# Altium footprint library PcbLib_ICs.PcbLib: 317 footprints (part 19 of 24) (continued)
## TO-220-2 [mm] (continued)
  text ".Designator" at 0.7,-5.162 h3
3D body "TO220-2.STEP": height 20.05, standoff -3.5, extent -1.55,-4.95 2.907,4.95

## TO-220-3 [mm]
height 4.57
pads (4):
  rect 3.2x2 hole 1.2: 1(3.3,2.5)
  oval 3.2x2 hole 1.2: 2(0,0) 3(3.3,-2.5)
  rect 16x12 smd paste-10: 2(15.444,0)
Top Overlay:
  circle w0.25: c0.75,2.5 r0.125
  lines w0.2: 6.2,-5.5 6.2,5.5
Top Paste:
  rectangle: 9.444,-5.1 10.444,-4.1
  rectangle: 10.678,-5.1 11.678,-4.1
  rectangle: 11.911,-5.1 12.911,-4.1
  rectangle: 13.144,-5.1 14.144,-4.1
  rectangle: 14.378,-5.1 15.378,-4.1
  rectangle: 15.611,-5.1 16.611,-4.1
  rectangle: 16.844,-5.1 17.844,-4.1
  rectangle: 9.444,-3.95 10.444,-2.95
  rectangle: 9.444,-2.8 10.444,-1.8
  rectangle: 9.444,-1.65 10.444,-0.65
  rectangle: 9.444,-0.5 10.444,0.5
  rectangle: 9.444,0.65 10.444,1.65
  rectangle: 9.444,1.8 10.444,2.8
  rectangle: 9.444,2.95 10.444,3.95
  rectangle: 9.444,4.1 10.444,5.1
  rectangle: 10.678,4.1 11.678,5.1
  rectangle: 10.678,2.95 11.678,3.95
  rectangle: 10.678,1.8 11.678,2.8
  rectangle: 10.678,0.65 11.678,1.65
  rectangle: 10.678,-0.5 11.678,0.5
  rectangle: 10.678,-1.65 11.678,-0.65
  rectangle: 10.678,-2.8 11.678,-1.8
  rectangle: 10.678,-3.95 11.678,-2.95
  rectangle: 11.911,4.1 12.911,5.1
  rectangle: 11.911,2.95 12.911,3.95
  rectangle: 11.911,1.8 12.911,2.8
  rectangle: 11.911,0.65 12.911,1.65
  rectangle: 11.911,-0.5 12.911,0.5
  rectangle: 11.911,-1.65 12.911,-0.65
  rectangle: 11.911,-2.8 12.911,-1.8
  rectangle: 11.911,-3.95 12.911,-2.95
  rectangle: 13.144,4.1 14.144,5.1
  rectangle: 13.144,2.95 14.144,3.95
  rectangle: 13.144,1.8 14.144,2.8
  rectangle: 13.144,0.65 14.144,1.65
  rectangle: 13.144,-0.5 14.144,0.5
  rectangle: 13.144,-1.65 14.144,-0.65
  rectangle: 13.144,-2.8 14.144,-1.8
  rectangle: 13.144,-3.95 14.144,-2.95
  rectangle: 14.378,4.1 15.378,5.1
  rectangle: 14.378,2.95 15.378,3.95
  rectangle: 14.378,1.8 15.378,2.8
  rectangle: 14.378,0.65 15.378,1.65
  rectangle: 14.378,-0.5 15.378,0.5
  rectangle: 14.378,-1.65 15.378,-0.65
  rectangle: 14.378,-2.8 15.378,-1.8
  rectangle: 14.378,-3.95 15.378,-2.95
  rectangle: 15.611,4.1 16.611,5.1
  rectangle: 15.611,2.95 16.611,3.95
  rectangle: 15.611,1.8 16.611,2.8
  rectangle: 15.611,0.65 16.611,1.65
  rectangle: 15.611,-0.5 16.611,0.5
  rectangle: 15.611,-1.65 16.611,-0.65
  rectangle: 15.611,-2.8 16.611,-1.8
  rectangle: 15.611,-3.95 16.611,-2.95
  rectangle: 16.844,4.1 17.844,5.1
  rectangle: 16.844,2.95 17.844,3.95
  rectangle: 16.844,1.8 17.844,2.8
  rectangle: 16.844,0.65 17.844,1.65
  rectangle: 16.844,-0.5 17.844,0.5
  rectangle: 16.844,-1.65 17.844,-0.65
  rectangle: 16.844,-2.8 17.844,-1.8
  rectangle: 16.844,-3.95 17.844,-2.95
Top Assy:
  circle w0.05: c20.076,0 r1.75
  lines w0.05: 7.296,-3.2 7.296,-5.01 ; 7.296,-1.8 7.296,-0.7 ; 7.296,0.7 7.296,1.8 ; 7.296,3.2 7.296,5 ; -0.45,-0.45 -0.45,0.45 ; -0.45,-0.45 0.546,-0.45 ; -0.45,-0.45 -0.455,-0.45 -0.455,0.45 -0.45,0.45 ; -0.45,0.45 0.546,0.45 ; 0.546,-0.45 0.546,0.45 ; 0.546,-0.45 3.796,-0.45 4.296,-0.7 7.469,-0.7 7.469,0.7 4.296,0.7 3.796,0.45 0.546,0.45 ; 2.791,2.05 2.791,2.95 ; 2.791,2.05 3.786,2.05 ; 2.791,2.05 2.783,2.05 2.783,2.95 2.791,2.95 ; 2.791,2.95 3.786,2.95 ; 2.801,-2.95 2.801,-2.05 ; 2.801,-2.95 3.786,-2.95 ; 2.801,-2.95 2.793,-2.95 2.793,-2.05 2.801,-2.05 ; 2.801,-2.05 3.786,-2.05 ; 3.786,-2.95 3.796,-2.95 4.296,-3.2 7.469,-3.2 7.469,-1.8 4.296,-1.8 3.796,-2.05 3.786,-2.05 ; 3.786,-2.95 3.786,-2.05 ; 3.786,2.05 3.796,2.05 4.296,1.8 7.469,1.8 7.469,3.2 4.296,3.2 3.796,2.95 3.786,2.95 ; 3.786,2.05 3.786,2.95 ; 7.296,-5.01 7.611,-4.695 ; 7.296,-5.01 16.286,-5.01 ; 7.296,5 7.611,4.685 ; 7.296,5 16.286,5 15.971,4.685 ; 7.611,-4.695 15.971,-4.695 ; 7.611,-4.695 7.611,4.685 ; 7.611,4.685 15.971,4.685 ; 15.971,-4.695 15.971,4.685 ; 15.971,-4.695 16.286,-5.01 ; 16.286,-5.01 19.296,-5.01 19.296,-4.2 20.943,-4.2 20.943,-5.01 22.796,-5.01 22.796,5.01 20.896,5.01 20.896,4.3 19.296,4.3 19.296,5.01 16.286,5.01 16.286,4 ; 16.286,-5.01 16.286,-4 ; 16.285,-4 16.285,4 ; 16.285,-4 16.286,-4 ; 16.285,4 16.286,4
  text ".Designator" at 5.327,-0.7 h3
3D body "TO-220.STEP": height 4.5, standoff -3.15, extent -0.325,-5.02 22.925,5

## TO-220-3 (hole mounting) [mm]
height 4.57
pads (5):
  rect 3.2x2 hole 1.2: 1(3.3,2.5)
  oval 3.2x2 hole 1.2: 2(0,0) 3(3.3,-2.5)
  rect 16x12 smd paste-10: 2(15.444,0)
  round 0 hole 3.4 unplated: 6(20.076,0)
Top Overlay:
  circle w0.25: c0.75,2.5 r0.125
  lines w0.2: 6.2,-5.5 6.2,5.5
Top Paste:
  rectangle: 16.844,-3.95 17.844,-2.95
  rectangle: 16.844,-2.8 17.844,-1.8
  rectangle: 16.844,-1.65 17.844,-0.65
  rectangle: 16.844,-0.5 17.844,0.5
  rectangle: 16.844,0.65 17.844,1.65
  rectangle: 16.844,1.8 17.844,2.8
  rectangle: 16.844,2.95 17.844,3.95
  rectangle: 16.844,4.1 17.844,5.1
  rectangle: 15.611,-3.95 16.611,-2.95
  rectangle: 15.611,-2.8 16.611,-1.8
  rectangle: 15.611,-1.65 16.611,-0.65
  rectangle: 15.611,-0.5 16.611,0.5
  rectangle: 15.611,0.65 16.611,1.65
  rectangle: 15.611,1.8 16.611,2.8
  rectangle: 15.611,2.95 16.611,3.95
  rectangle: 15.611,4.1 16.611,5.1
  rectangle: 14.378,-3.95 15.378,-2.95
  rectangle: 14.378,-2.8 15.378,-1.8
  rectangle: 14.378,-1.65 15.378,-0.65
  rectangle: 14.378,-0.5 15.378,0.5
  rectangle: 14.378,0.65 15.378,1.65
  rectangle: 14.378,1.8 15.378,2.8
  rectangle: 14.378,2.95 15.378,3.95
  rectangle: 14.378,4.1 15.378,5.1
  rectangle: 13.144,-3.95 14.144,-2.95
  rectangle: 13.144,-2.8 14.144,-1.8
  rectangle: 13.144,-1.65 14.144,-0.65
  rectangle: 13.144,-0.5 14.144,0.5
  rectangle: 13.144,0.65 14.144,1.65
  rectangle: 13.144,1.8 14.144,2.8
  rectangle: 13.144,2.95 14.144,3.95
  rectangle: 13.144,4.1 14.144,5.1
  rectangle: 11.911,-3.95 12.911,-2.95
  rectangle: 11.911,-2.8 12.911,-1.8
  rectangle: 11.911,-1.65 12.911,-0.65
  rectangle: 11.911,-0.5 12.911,0.5
  rectangle: 11.911,0.65 12.911,1.65
  rectangle: 11.911,1.8 12.911,2.8
  rectangle: 11.911,2.95 12.911,3.95
  rectangle: 11.911,4.1 12.911,5.1
  rectangle: 10.678,-3.95 11.678,-2.95
  rectangle: 10.678,-2.8 11.678,-1.8
  rectangle: 10.678,-1.65 11.678,-0.65
  rectangle: 10.678,-0.5 11.678,0.5
  rectangle: 10.678,0.65 11.678,1.65
  rectangle: 10.678,1.8 11.678,2.8
  rectangle: 10.678,2.95 11.678,3.95
  rectangle: 10.678,4.1 11.678,5.1
  rectangle: 9.444,4.1 10.444,5.1
  rectangle: 9.444,2.95 10.444,3.95
  rectangle: 9.444,1.8 10.444,2.8
  rectangle: 9.444,0.65 10.444,1.65
  rectangle: 9.444,-0.5 10.444,0.5
  rectangle: 9.444,-1.65 10.444,-0.65
  rectangle: 9.444,-2.8 10.444,-1.8
  rectangle: 9.444,-3.95 10.444,-2.95
  rectangle: 16.844,-5.1 17.844,-4.1
  rectangle: 15.611,-5.1 16.611,-4.1
  rectangle: 14.378,-5.1 15.378,-4.1
  rectangle: 13.144,-5.1 14.144,-4.1
  rectangle: 11.911,-5.1 12.911,-4.1
  rectangle: 10.678,-5.1 11.678,-4.1
  rectangle: 9.444,-5.1 10.444,-4.1
Top Assy:
  circle w0.05: c20.076,0 r1.75
  lines w0.05: 7.296,-3.2 7.296,-5.01 ; 7.296,-1.8 7.296,-0.7 ; 7.296,0.7 7.296,1.8 ; 7.296,3.2 7.296,5 ; -0.45,-0.45 -0.455,-0.45 -0.455,0.45 -0.45,0.45 ; -0.45,-0.45 0.546,-0.45 ; -0.45,-0.45 -0.45,0.45 ; -0.45,0.45 0.546,0.45 ; 0.546,-0.45 3.796,-0.45 4.296,-0.7 7.469,-0.7 7.469,0.7 4.296,0.7 3.796,0.45 0.546,0.45 ; 0.546,-0.45 0.546,0.45 ; 2.791,2.05 2.783,2.05 2.783,2.95 2.791,2.95 ; 2.791,2.05 3.786,2.05 ; 2.791,2.05 2.791,2.95 ; 2.791,2.95 3.786,2.95 ; 2.801,-2.95 2.793,-2.95 2.793,-2.05 2.801,-2.05 ; 2.801,-2.95 3.786,-2.95 ; 2.801,-2.95 2.801,-2.05 ; 2.801,-2.05 3.786,-2.05 ; 3.786,-2.95 3.786,-2.05 ; 3.786,-2.95 3.796,-2.95 4.296,-3.2 7.469,-3.2 7.469,-1.8 4.296,-1.8 3.796,-2.05 3.786,-2.05 ; 3.786,2.05 3.786,2.95 ; 3.786,2.05 3.796,2.05 4.296,1.8 7.469,1.8 7.469,3.2 4.296,3.2 3.796,2.95 3.786,2.95 ; 7.296,-5.01 16.286,-5.01 ; 7.296,-5.01 7.611,-4.695 ; 7.296,5 16.286,5 15.971,4.685 ; 7.296,5 7.611,4.685 ; 7.611,-4.695 7.611,4.685 ; 7.611,-4.695 15.971,-4.695 ; 7.611,4.685 15.971,4.685 ; 15.971,-4.695 16.286,-5.01 ; 15.971,-4.695 15.971,4.685 ; 16.286,-5.01 16.286,-4 ; 16.286,-5.01 19.296,-5.01 19.296,-4.2 20.943,-4.2 20.943,-5.01 22.796,-5.01 22.796,5.01 20.896,5.01 20.896,4.3 19.296,4.3 19.296,5.01 16.286,5.01 16.286,4 ; 16.285,-4 16.286,-4 ; 16.285,-4 16.285,4 ; 16.285,4 16.286,4
  text ".Designator" at 5.327,-0.7 h3
3D body "TO-220.STEP": height 4.5, standoff -3.15, extent -0.325,-5.02 22.925,5

## TO-220-5 [mm]
height 4.57
pads (6):
  rect 3.2x2 hole 1.2: 1(0,3.4)
  oval 3.2x2 hole 1.2: 2(3.55,1.7) 3(0,0) 4(3.55,-1.7) 5(0,-3.4)
  rect 16x12 smd paste-10: 6(15.444,0)
Top Overlay:
  circle w0.25: c0,5.2 r0.125
  lines w0.2: 6.2,-5.5 6.2,5.5
Top Paste:
  rectangle: 9.444,-5.1 10.444,-4.1
  rectangle: 10.678,-5.1 11.678,-4.1
  rectangle: 11.911,-5.1 12.911,-4.1
  rectangle: 13.144,-5.1 14.144,-4.1
  rectangle: 14.378,-5.1 15.378,-4.1
  rectangle: 15.611,-5.1 16.611,-4.1
  rectangle: 16.844,-5.1 17.844,-4.1
  rectangle: 9.444,-3.95 10.444,-2.95
  rectangle: 9.444,-2.8 10.444,-1.8
  rectangle: 9.444,-1.65 10.444,-0.65
  rectangle: 9.444,-0.5 10.444,0.5
  rectangle: 9.444,0.65 10.444,1.65
  rectangle: 9.444,1.8 10.444,2.8
  rectangle: 9.444,2.95 10.444,3.95
  rectangle: 9.444,4.1 10.444,5.1
  rectangle: 10.678,4.1 11.678,5.1
  rectangle: 10.678,2.95 11.678,3.95
  rectangle: 10.678,1.8 11.678,2.8
  rectangle: 10.678,0.65 11.678,1.65
  rectangle: 10.678,-0.5 11.678,0.5
  rectangle: 10.678,-1.65 11.678,-0.65
  rectangle: 10.678,-2.8 11.678,-1.8
  rectangle: 10.678,-3.95 11.678,-2.95
  rectangle: 11.911,4.1 12.911,5.1
  rectangle: 11.911,2.95 12.911,3.95
  rectangle: 11.911,1.8 12.911,2.8
  rectangle: 11.911,0.65 12.911,1.65
  rectangle: 11.911,-0.5 12.911,0.5
  rectangle: 11.911,-1.65 12.911,-0.65
  rectangle: 11.911,-2.8 12.911,-1.8
  rectangle: 11.911,-3.95 12.911,-2.95
  rectangle: 13.144,4.1 14.144,5.1
  rectangle: 13.144,2.95 14.144,3.95
  rectangle: 13.144,1.8 14.144,2.8
  rectangle: 13.144,0.65 14.144,1.65
  rectangle: 13.144,-0.5 14.144,0.5
  rectangle: 13.144,-1.65 14.144,-0.65
  rectangle: 13.144,-2.8 14.144,-1.8
  rectangle: 13.144,-3.95 14.144,-2.95
  rectangle: 14.378,4.1 15.378,5.1
  rectangle: 14.378,2.95 15.378,3.95
  rectangle: 14.378,1.8 15.378,2.8
  rectangle: 14.378,0.65 15.378,1.65
  rectangle: 14.378,-0.5 15.378,0.5
  rectangle: 14.378,-1.65 15.378,-0.65
  rectangle: 14.378,-2.8 15.378,-1.8
  rectangle: 14.378,-3.95 15.378,-2.95
  rectangle: 15.611,4.1 16.611,5.1
  rectangle: 15.611,2.95 16.611,3.95
  rectangle: 15.611,1.8 16.611,2.8
  rectangle: 15.611,0.65 16.611,1.65
  rectangle: 15.611,-0.5 16.611,0.5
  rectangle: 15.611,-1.65 16.611,-0.65
  rectangle: 15.611,-2.8 16.611,-1.8
  rectangle: 15.611,-3.95 16.611,-2.95
  rectangle: 16.844,4.1 17.844,5.1
  rectangle: 16.844,2.95 17.844,3.95
  rectangle: 16.844,1.8 17.844,2.8
  rectangle: 16.844,0.65 17.844,1.65
  rectangle: 16.844,-0.5 17.844,0.5
  rectangle: 16.844,-1.65 17.844,-0.65
  rectangle: 16.844,-2.8 17.844,-1.8
  rectangle: 16.844,-3.95 17.844,-2.95
Top Assy:
  circle w0.05: c19.3,0 r1.925
  lines w0.05: 6.5,-4 4.85,-4 ; 6.5,-2.8 4.85,-2.8 ; 6.5,-2.3 4.95,-2.3 ; 6.5,-1.1 4.95,-1.1 ; 6.5,-0.62 4.85,-0.62 ; 6.5,0.62 4.85,0.62 ; 6.5,1.1 4.95,1.1 ; 6.5,2.3 4.95,2.3 ; 6.5,2.8 4.85,2.8 ; 6.5,4 4.85,4 ; 15.625,-5.125 22.225,-5.125 22.225,5.125 15.625,5.125 ; 0.583,-3.9 0.583,-2.9 ; 0.583,-3.9 0,-3.9 0,-2.9 0.583,-2.9 ; 0.583,-3.9 3.9,-3.9 3.9,-4 4.394,-4 ; 0.583,-2.9 3.9,-2.9 3.9,-2.8 4.394,-2.8 ; 0.583,-0.5 0.583,0.5 ; 0.583,-0.5 0,-0.5 0,0.5 0.583,0.5 ; 0.583,-0.5 3.9,-0.5 3.9,-0.62 4.394,-0.62 ; 0.583,0.5 3.9,0.5 3.9,0.62 4.394,0.62 ; 0.583,2.9 0.583,3.9 ; 0.583,2.9 0,2.9 0,3.9 0.583,3.9 ; 0.583,2.9 3.9,2.9 3.9,2.8 4.394,2.8 ; 0.583,3.9 3.9,3.9 3.9,4 4.394,4 ; 4.394,-4 4.394,-2.8 ; 4.394,-4 4.85,-4 ; 4.394,-2.8 4.85,-2.8 ; 4.394,-0.62 4.394,0.62 ; 4.394,-0.62 4.85,-0.62 ; 4.394,0.62 4.85,0.62 ; 4.394,2.8 4.394,4 ; 4.394,2.8 4.85,2.8 ; 4.394,4 4.85,4 ; 4.85,-4 4.85,-2.8 ; 4.85,-0.62 4.85,0.62 ; 4.85,2.8 4.85,4 ; 4.95,-2.3 4.95,-1.1 ; 4.95,-2.3 3.75,-2.3 3.75,-2.2 3.75,-1.2 3.75,-1.1 4.95,-1.1 ; 4.95,1.1 4.95,2.3 ; 4.95,1.1 3.75,1.1 3.75,1.2 3.75,2.2 3.75,2.3 4.95,2.3 ; 6.5,-4.948 6.5,-5.074 6.71,-5.2 15.625,-5.2 15.625,-5.019 ; 6.5,-4.948 6.5,4.948 ; 6.5,-4.948 8.858,-4.948 ; 6.5,4.948 6.5,5.074 6.71,5.2 15.625,5.2 15.625,5.019 ; 6.5,4.948 8.858,4.948 ; 8.858,-4.948 cw(c10,-5.2) 11.142,-4.948 ; 8.858,-4.948 8.956,-5.065 9.003,-5.118 ; 8.858,4.948 ccw(c10,5.2) 11.142,4.948 ; 8.858,4.948 8.916,5.018 9.003,5.118 ; 9.003,-5.118 cw(c10,-5.2) 10.997,-5.118 ; 9.003,-5.118 10.997,-5.118 ; 9.003,5.118 ccw(c10,5.2) 10.997,5.118 ; 9.003,5.118 10.997,5.118 ; 10.997,-5.118 11.084,-5.018 11.142,-4.948 ; 10.997,5.118 11.044,5.065 11.142,4.948 ; 11.142,-4.948 14.388,-4.948 ; 11.142,4.948 14.388,4.948 ; 14.388,-4.948 15.625,-5.019 ; 14.388,-4.948 14.388,4.948 ; 14.388,4.948 15.625,5.019 ; 15.625,-5.019 15.625,5.019
  text ".Designator" at 5.282,-0.7 h3
3D body "User Library-TO-220-5_bent_leads.step": height 4.85, standoff -6.05, extent -0.2,-5.2 22.025,5.2

## TO-220-5 (hole mounting) [mm]
height 4.57
pads (7):
  rect 3.2x2 hole 1.2: 1(0,3.4)
  oval 3.2x2 hole 1.2: 2(3.55,1.7) 3(0,0) 4(3.55,-1.7) 5(0,-3.4)
  rect 16x12 smd paste-10: 6(15.444,0)
  round 0 hole 3.4 unplated: 6(19.3,0)
Top Overlay:
  circle w0.25: c0,5.2 r0.125
  lines w0.2: 6.2,-5.5 6.2,5.5
Top Paste:
  rectangle: 16.844,-3.95 17.844,-2.95
  rectangle: 16.844,-2.8 17.844,-1.8
  rectangle: 16.844,-1.65 17.844,-0.65
  rectangle: 16.844,-0.5 17.844,0.5
  rectangle: 16.844,0.65 17.844,1.65
  rectangle: 16.844,1.8 17.844,2.8
  rectangle: 16.844,2.95 17.844,3.95
  rectangle: 16.844,4.1 17.844,5.1
  rectangle: 15.611,-3.95 16.611,-2.95
  rectangle: 15.611,-2.8 16.611,-1.8
  rectangle: 15.611,-1.65 16.611,-0.65
  rectangle: 15.611,-0.5 16.611,0.5
  rectangle: 15.611,0.65 16.611,1.65
  rectangle: 15.611,1.8 16.611,2.8
  rectangle: 15.611,2.95 16.611,3.95
  rectangle: 15.611,4.1 16.611,5.1
  rectangle: 14.378,-3.95 15.378,-2.95
  rectangle: 14.378,-2.8 15.378,-1.8
  rectangle: 14.378,-1.65 15.378,-0.65
  rectangle: 14.378,-0.5 15.378,0.5
  rectangle: 14.378,0.65 15.378,1.65
  rectangle: 14.378,1.8 15.378,2.8
  rectangle: 14.378,2.95 15.378,3.95
  rectangle: 14.378,4.1 15.378,5.1
  rectangle: 13.144,-3.95 14.144,-2.95
  rectangle: 13.144,-2.8 14.144,-1.8
  rectangle: 13.144,-1.65 14.144,-0.65
  rectangle: 13.144,-0.5 14.144,0.5
  rectangle: 13.144,0.65 14.144,1.65
  rectangle: 13.144,1.8 14.144,2.8
  rectangle: 13.144,2.95 14.144,3.95
  rectangle: 13.144,4.1 14.144,5.1
  rectangle: 11.911,-3.95 12.911,-2.95
  rectangle: 11.911,-2.8 12.911,-1.8
  rectangle: 11.911,-1.65 12.911,-0.65
  rectangle: 11.911,-0.5 12.911,0.5
  rectangle: 11.911,0.65 12.911,1.65
  rectangle: 11.911,1.8 12.911,2.8
  rectangle: 11.911,2.95 12.911,3.95
  rectangle: 11.911,4.1 12.911,5.1
  rectangle: 10.678,-3.95 11.678,-2.95
  rectangle: 10.678,-2.8 11.678,-1.8
  rectangle: 10.678,-1.65 11.678,-0.65
  rectangle: 10.678,-0.5 11.678,0.5
  rectangle: 10.678,0.65 11.678,1.65
  rectangle: 10.678,1.8 11.678,2.8
  rectangle: 10.678,2.95 11.678,3.95
  rectangle: 10.678,4.1 11.678,5.1
  rectangle: 9.444,4.1 10.444,5.1
  rectangle: 9.444,2.95 10.444,3.95
  rectangle: 9.444,1.8 10.444,2.8
  rectangle: 9.444,0.65 10.444,1.65
  rectangle: 9.444,-0.5 10.444,0.5
  rectangle: 9.444,-1.65 10.444,-0.65
  rectangle: 9.444,-2.8 10.444,-1.8
  rectangle: 9.444,-3.95 10.444,-2.95
  rectangle: 16.844,-5.1 17.844,-4.1
  rectangle: 15.611,-5.1 16.611,-4.1
  rectangle: 14.378,-5.1 15.378,-4.1
  rectangle: 13.144,-5.1 14.144,-4.1
  rectangle: 11.911,-5.1 12.911,-4.1
  rectangle: 10.678,-5.1 11.678,-4.1
  rectangle: 9.444,-5.1 10.444,-4.1
Top Assy:
  circle w0.05: c19.3,0 r1.925
  lines w0.05: 6.5,-4 4.85,-4 ; 6.5,-2.8 4.85,-2.8 ; 6.5,-2.3 4.95,-2.3 ; 6.5,-1.1 4.95,-1.1 ; 6.5,-0.62 4.85,-0.62 ; 6.5,0.62 4.85,0.62 ; 6.5,1.1 4.95,1.1 ; 6.5,2.3 4.95,2.3 ; 6.5,2.8 4.85,2.8 ; 6.5,4 4.85,4 ; 15.625,-5.125 22.225,-5.125 22.225,5.125 15.625,5.125 ; 0.583,-3.9 3.9,-3.9 3.9,-4 4.394,-4 ; 0.583,-3.9 0,-3.9 0,-2.9 0.583,-2.9 ; 0.583,-3.9 0.583,-2.9 ; 0.583,-2.9 3.9,-2.9 3.9,-2.8 4.394,-2.8 ; 0.583,-0.5 3.9,-0.5 3.9,-0.62 4.394,-0.62 ; 0.583,-0.5 0,-0.5 0,0.5 0.583,0.5 ; 0.583,-0.5 0.583,0.5 ; 0.583,0.5 3.9,0.5 3.9,0.62 4.394,0.62 ; 0.583,2.9 3.9,2.9 3.9,2.8 4.394,2.8 ; 0.583,2.9 0,2.9 0,3.9 0.583,3.9 ; 0.583,2.9 0.583,3.9 ; 0.583,3.9 3.9,3.9 3.9,4 4.394,4 ; 4.394,-4 4.85,-4 ; 4.394,-4 4.394,-2.8 ; 4.394,-2.8 4.85,-2.8 ; 4.394,-0.62 4.85,-0.62 ; 4.394,-0.62 4.394,0.62 ; 4.394,0.62 4.85,0.62 ; 4.394,2.8 4.85,2.8 ; 4.394,2.8 4.394,4 ; 4.394,4 4.85,4 ; 4.85,-4 4.85,-2.8 ; 4.85,-0.62 4.85,0.62 ; 4.85,2.8 4.85,4 ; 4.95,-2.3 3.75,-2.3 3.75,-2.2 3.75,-1.2 3.75,-1.1 4.95,-1.1 ; 4.95,-2.3 4.95,-1.1 ; 4.95,1.1 3.75,1.1 3.75,1.2 3.75,2.2 3.75,2.3 4.95,2.3 ; 4.95,1.1 4.95,2.3 ; 6.5,-4.948 8.858,-4.948 ; 6.5,-4.948 6.5,4.948 ; 6.5,-4.948 6.5,-5.074 6.71,-5.2 15.625,-5.2 15.625,-5.019 ; 6.5,4.948 8.858,4.948 ; 6.5,4.948 6.5,5.074 6.71,5.2 15.625,5.2 15.625,5.019 ; 8.858,-4.948 cw(c10,-5.2) 11.142,-4.948 ; 8.858,-4.948 8.956,-5.065 9.003,-5.118 ; 8.858,4.948 ccw(c10,5.2) 11.142,4.948 ; 8.858,4.948 8.916,5.018 9.003,5.118 ; 9.003,-5.118 cw(c10,-5.2) 10.997,-5.118 ; 9.003,-5.118 10.997,-5.118 ; 9.003,5.118 ccw(c10,5.2) 10.997,5.118 ; 9.003,5.118 10.997,5.118 ; 10.997,-5.118 11.084,-5.018 11.142,-4.948 ; 10.997,5.118 11.044,5.065 11.142,4.948 ; 11.142,-4.948 14.388,-4.948 ; 11.142,4.948 14.388,4.948 ; 14.388,-4.948 14.388,4.948 ; 14.388,-4.948 15.625,-5.019 ; 14.388,4.948 15.625,5.019 ; 15.625,-5.019 15.625,5.019
  text ".Designator" at 5.282,-0.7 h3
3D body "User Library-TO-220-5_bent_leads.step": height 4.85, standoff -6.05, extent -0.2,-5.2 22.025,5.2

## TO-220-5(VERTICAL) [mm]
height 4.57
pads (5):
  rect 3.2x2 hole 1.2: 1(0,3.4)
  oval 3.2x2 hole 1.2: 2(4.8,1.7) 3(0,0) 4(4.8,-1.7) 5(0,-3.4)
Top Overlay:
  circle w0.25: c-0.5,5.75 r0.125
  rectangle: 6.9,-5.2 7.8,5.2
  lines w0.2: 6.9,5.1 -2.1,5.1 -2.1,-5.1 7.3,-5.1
Top Assy:
  lines w0.05: 3.183,-3.845 0.34,-3.845 ; 3.183,-2.955 0.34,-2.955 ; 3.183,-0.445 0.34,-0.445 ; 3.183,0.445 0.34,0.445 ; 3.183,2.955 0.34,2.955 ; 3.183,3.845 0.34,3.845 ; 0.34,-3.845 0.34,-2.955 ; 0.34,-3.845 0,-3.845 0,-2.955 0.34,-2.955 ; 0.34,-0.445 0.34,0.445 ; 0.34,-0.445 0,-0.445 0,0.445 0.34,0.445 ; 0.34,2.955 0.34,3.845 ; 0.34,2.955 0,2.955 0,3.845 0.34,3.845 ; 6.483,-5.08 6.483,5.08 ; 6.483,-5.08 7.753,-5.08 7.753,5.08 6.483,5.08 ; 6.483,-5.08 3.369,-4.862 cw(c3.383,-4.663) 3.183,-4.663 3.183,4.663 cw(c3.383,4.663) 3.369,4.862 6.483,5.08
  text ".Designator" at 9.7,-5.162 h3
3D body "User Library-TO-220-5V.step": height 21.58, standoff -3.47, extent 0,-5.08 7.753,5.08

## TO-220_with_TO-247 (VERTICAL)SLOT [mm]
height 4.57
pads (3):
  rect 3.5x4.8 hole 4 slot 1.5 at 0 deg: 1(0,4.3)
  oval 4x2.4 hole 1.8: 2(0,0)
  oval 3.5x4.8 hole 4 slot 1.5 at 0 deg: 3(0,-4.3)
Top Overlay:
  circle w0.6: c-3,5.5 r0.3
  rectangle: 2.8,-8.1 3.65,8.1
  rectangle: 2.5,-5 3.4,5
  lines w0.2: -2.2,-8 2.8,-8 2.8,8 -2.2,8
Top Assy:
  lines w0.05: -1.53,-2.69 -1.53,-2.737 -1.52,-2.737 ; -1.53,-0.067 -1.53,0.003 ; -1.53,0.026 -1.53,0.003 ; -1.53,0.459 -1.53,0.455 -1.52,0.455 ; -1.53,0.468 -1.52,0.468 ; -1.53,0.591 -1.53,0.686 ; -1.53,1.238 -1.53,1.343 ; -1.53,1.689 -1.53,1.783 ; -1.53,2.348 -1.53,2.442 ; -1.53,3.006 -1.53,3.02 -1.52,3.02 ; -1.52,-2.673 -1.53,-2.673 -1.53,-2.473 ; -1.52,-2.473 -1.53,-2.473 ; -1.52,-2.269 -1.53,-2.269 ; -1.52,-2.109 -1.53,-2.109 -1.53,-2.269 ; -1.52,-1.961 -1.53,-1.961 -1.53,-1.94 ; -1.52,-1.94 -1.53,-1.94 ; -1.52,-1.393 -1.53,-1.393 ; -1.52,-1.391 -1.53,-1.391 ; -1.52,-1.281 -1.53,-1.281 ; -1.52,-0.735 -1.53,-0.735 ; -1.52,-0.623 -1.53,-0.623 ; -1.52,-0.076 -1.53,-0.076 -1.53,-0.623 ; -1.52,0.003 -1.53,0.003 ; -1.52,0.035 -1.53,0.035 -1.53,0.363 -1.52,0.363 ; -1.52,0.473 -1.53,0.473 -1.53,0.583 -1.52,0.583 ; -1.52,0.694 -1.53,0.694 -1.53,1.241 -1.52,1.241 ; -1.52,1.352 -1.53,1.352 -1.53,1.68 -1.52,1.68 ; -1.52,1.792 -1.53,1.792 -1.53,1.901 ; -1.52,1.901 -1.53,1.901 ; -1.52,2.339 -1.53,2.339 -1.53,1.901 ; -1.52,2.45 -1.53,2.45 -1.53,2.997 -1.52,2.997 ; -1.52,3.109 -1.53,3.109 -1.53,3.656 -1.52,3.656 ; 1.657,-4.894 -1.064,-4.639 ; 1.657,4.902 -1.064,4.647 ; 1.674,-4.946 -1.067,-4.689 ; 1.674,4.953 -1.067,4.696 ; -1.53,-2.473 -1.53,-2.269 ; -1.53,-1.94 -1.53,-1.393 ; -1.53,-1.393 -1.53,-1.391 ; -1.53,-1.391 -1.53,-1.281 ; -1.53,-1.281 -1.53,-0.735 ; -1.53,-0.735 -1.53,-0.623 ; -1.52,-4.191 ccw(c-1.02,-4.191) -1.067,-4.689 ; -1.52,-4.191 -1.52,4.198 ; -1.52,-4.191 -1.472,-4.191 ; -1.52,4.198 cw(c-1.02,4.198) -1.067,4.696 ; -1.52,4.198 -1.472,4.198 ; -1.472,-4.191 ccw(c-1.022,-4.191) -1.064,-4.639 ; -1.472,-4.191 -1.472,4.198 ; -1.472,4.198 cw(c-1.022,4.198) -1.064,4.647 ; -1.067,-4.689 cw(c-0.688,-4.687) -1.064,-4.639 ; -1.067,4.696 ccw(c-0.688,4.694) -1.064,4.647 ; 1.657,-4.926 ccw(c1.677,-4.926) 1.677,-4.946 ; 1.657,-4.926 ccw(c1.676,-4.924) 1.677,-4.943 ; 1.657,-4.926 1.657,-3.436 ; 1.657,-3.436 ccw(c1.676,-3.434) 1.677,-3.452 ; 1.657,-3.436 1.657,3.443 ; 1.657,-3.436 1.677,-3.436 ; 1.657,3.443 cw(c1.676,3.441) 1.677,3.46 ; 1.657,3.443 1.657,4.934 ; 1.657,3.443 1.677,3.443 ; 1.657,4.934 cw(c1.677,4.934) 1.677,4.954 ; 1.657,4.934 cw(c1.676,4.932) 1.677,4.95 ; 1.677,-4.946 2.907,-4.946 ; 1.677,-4.946 1.677,-4.943 ; 1.677,-4.943 1.677,-3.452 ; 1.677,-4.943 2.907,-4.943 ; 1.677,-3.452 1.677,-3.436 ; 1.677,-3.452 2.907,-3.452 ; 1.677,-3.436 1.677,3.443 ; 1.677,-3.436 2.907,-3.436 ; 1.677,3.443 2.907,3.443 ; 1.677,3.443 1.677,3.46 ; 1.677,3.46 2.907,3.46 ; 1.677,3.46 1.677,4.95 ; 1.677,4.95 2.907,4.95 ; 1.677,4.95 1.677,4.954 ; 1.677,4.954 2.907,4.954 ; 2.907,-4.946 ccw(c2.907,-4.926) 2.927,-4.926 ; 2.907,-4.946 2.927,-4.946 2.927,-4.926 ; 2.907,-4.946 2.907,-4.943 ; 2.907,-4.943 ccw(c2.909,-4.924) 2.927,-4.926 ; 2.907,-4.943 2.907,-3.452 ; 2.907,-3.452 ccw(c2.909,-3.434) 2.927,-3.436 ; 2.907,-3.452 2.907,-3.436 ; 2.907,-3.436 2.907,3.443 ; 2.907,-3.436 2.927,-3.436 ; 2.907,3.443 2.907,3.46 ; 2.907,3.443 2.927,3.443 ; 2.907,3.46 cw(c2.909,3.441) 2.927,3.443 ; 2.907,3.46 2.907,4.95 ; 2.907,4.95 cw(c2.909,4.932) 2.927,4.934 ; 2.907,4.95 2.907,4.954 ; 2.907,4.954 cw(c2.907,4.934) 2.927,4.934 ; 2.907,4.954 2.927,4.954 2.927,4.934 ; 2.927,-4.926 2.927,-3.436 ; 2.927,-3.436 2.927,3.443 ; 2.927,3.443 2.927,4.934
  text ".Designator" at 0.7,-5.162 h3
3D body "User Library-TO220-A PCB.step": height 19.99, standoff -3.5, extent -1.55,-4.95 2.907,4.95